# Altium footprint library LOGTURTLE_APR_25_TX.PcbLib: 88 footprints (part 2 of 6)
Each footprint in its own frame and in the unit in brackets; x right, y up, seen from the top. Pads: shape width x height; smd on the part's side, far side on the other; paste and mask are expansions set on the pad; w line width, h text height; cw(c..) or ccw(c..) is an arc to the next point about the centre after c.
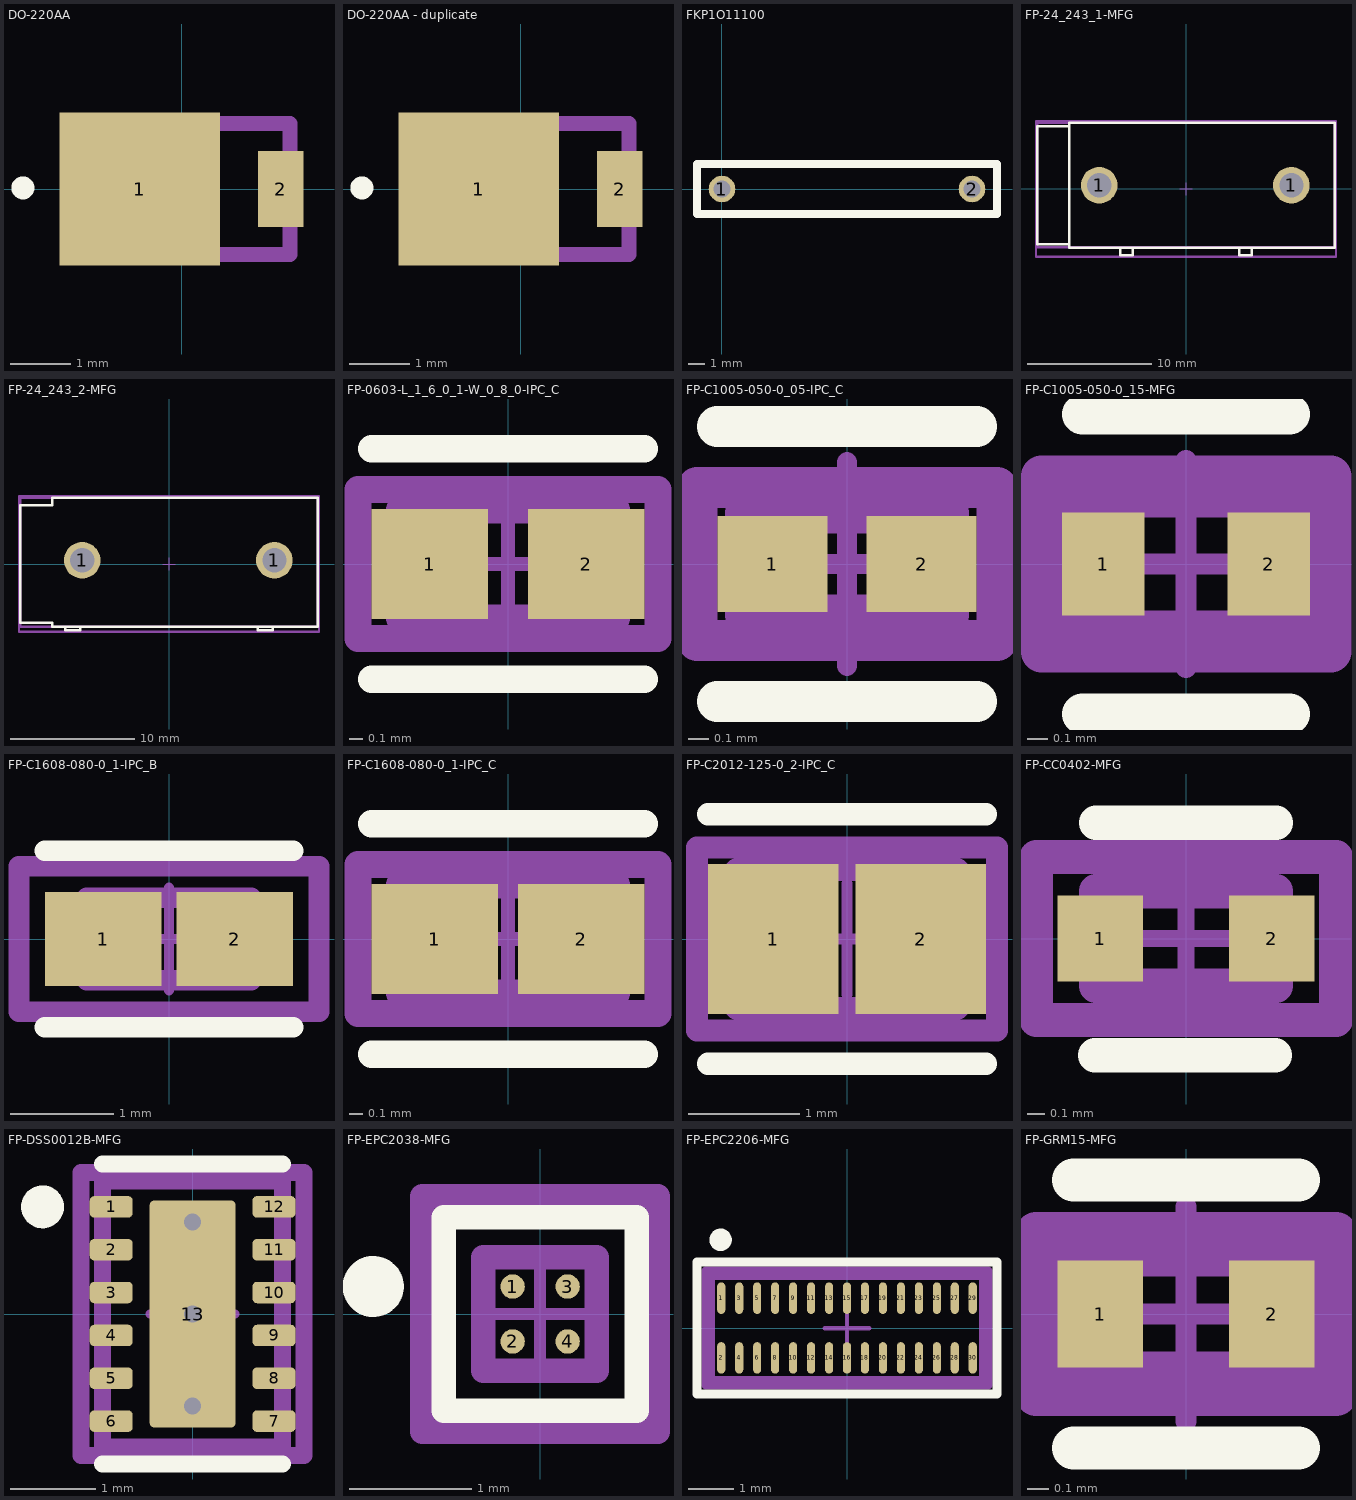
[diagram p1: the footprints below, top view; thin cyan lines are the x and y axes]

## DO-220AA [mil]
pads (2):
  rect 105.12x100 smd: 1(-27.5,0)
  rect 30x50 smd: 2(65.06,0)
Top Overlay:
  circle w10: c-104.06,0.75 r2.55
Mechanical 13:
  lines w10: -71.06,-42.91 71.06,-42.91 71.06,42.91 -71.06,42.91 -71.06,-42.91
3D body "SS2PH10-M3_84A.stp": height 39.37, standoff 0, extent -74.73,-40.07 76.84,39.85

## DO-220AA - duplicate [mil]
pads (2):
  rect 105.12x100 smd: 1(-27.5,0)
  rect 30x50 smd: 2(65.06,0)
Top Overlay:
  circle w10: c-104.06,0.75 r2.55
Mechanical 13:
  lines w10: -71.06,-42.91 71.06,-42.91 71.06,42.91 -71.06,42.91 -71.06,-42.91
3D body "SS2PH10-M3_84A.stp": height 39.37, standoff 0, extent -74.73,-40.07 76.84,39.85

## FKP1O11100 [mm]
pads (2):
  round 1.6 hole 1: 1(0,0) 2(15,0)
Top Overlay:
  lines w0.5: -1.5,-1.5 -1.5,1.5 0,1.5 15,1.5 16.5,1.5 16.5,-1.5 15,-1.5 0,-1.5 -1.5,-1.5

## FP-24_243_1-MFG [mm]
pads (2):
  round 2.95 hole 1.95 paste-2539.97 mask+0: 1(-7,0.3) 1(8.5,0.3)
Top Overlay:
  lines w0.2: -12,-4.45 -9.4,-4.45 -9.4,5.05 -12,5.05 -12,-4.45 ; -9.4,-4.75 12,-4.75 12,5.35 -9.4,5.35 -9.4,-4.75 ; -5.3,-5.35 -4.3,-5.35 -4.3,-4.75 -5.3,-4.75 -5.3,-5.35 ; 4.3,-5.35 5.3,-5.35 5.3,-4.75 4.3,-4.75 4.3,-5.35
Top 3D Body:
  lines w0.2: -12,-4.699 12,-4.699 12,5.35 -12,5.35 -12,-4.699
Top Courtyard:
  lines w0.2: -12.1,-5.45 12.1,-5.45 12.1,5.45 -12.1,5.45 -12.1,-5.45
Top Assembly:
  lines w0.2: -12.1,-5.461 12.1,-5.461 12.1,5.45 -12.1,5.45 -12.1,-5.461
  text ".Designator" at 0,0.188 h1
Top Component Center:
  lines w0.1: -0.5,0 0.5,0 ; 0,-0.5 0,0.5
3D body "Conn_Multicomp_24_243_1_eec.STEP": height 0.25, standoff 0, extent -10.576,-4.815 13.624,6.085

## FP-24_243_2-MFG [mm]
pads (2):
  round 2.95 hole 1.95 paste-2539.97 mask+0: 1(-7,0.3) 1(8.5,0.3)
Top Overlay:
  lines w0.2: -8.35,-5.05 -8.35,-5.35 -7.15,-5.35 -7.15,-5.05 ; 7.15,-5.05 7.15,-5.35 8.35,-5.35 8.35,-5.05 ; -12,-4.75 -9.4,-4.75 -9.4,-5.05 12,-5.05 12,5.35 -9.4,5.35 -9.4,4.75 -12,4.75 -12,-4.75
Top 3D Body:
  lines w0.2: -12,-5.08 12,-5.08 12,5.35 -12,5.35 -12,-5.08
Top Courtyard:
  lines w0.2: -12.1,-5.45 12.1,-5.45 12.1,5.45 -12.1,5.45 -12.1,-5.45
Top Assembly:
  lines w0.2: -12.1,-5.45 12.1,-5.45 12.1,5.45 -12.1,5.45 -12.1,-5.45
  text ".Designator" at 0,0.188 h1
Top Component Center:
  lines w0.1: -0.5,0 0.5,0 ; 0,-0.5 0,0.5
3D body "Conn_Multicomp_24_243_2_eec.STEP": height 0.25, standoff 0, extent -12.1,-5.45 12.1,5.45

## FP-0603-L_1_6_0_1-W_0_8_0-IPC_C [mm]
pads (2):
  rect 0.858x0.812 smd paste+0 mask+0: 1(-0.577,0) 2(0.577,0)
Top Overlay:
  lines w0.2: -1.006,-0.85 1.006,-0.85 ; -1.006,0.85 1.006,0.85
Top 3D Body:
  lines w0.2: -0.8,-0.4 -0.8,0.4 0.8,0.4 0.8,-0.4 -0.8,-0.4
Top Courtyard:
  lines w0.2: -1.106,-0.55 -1.106,0.55 1.106,0.55 1.106,-0.55 -1.106,-0.55
Top Assembly:
  lines w0.2: -1.106,-0.55 -1.106,0.55 1.106,0.55 1.106,-0.55 -1.106,-0.55
  text ".Designator" at 0,0.188 h1
Top Component Center:
  lines w0.1: -0.5,0 0.5,0 ; 0,-0.5 0,0.5
3D body "Cap_Taiyo_Yuden_JMK107BJ105KAHT_eec.STEP": height 0.25, standoff 0, extent -1.106,-0.55 1.106,0.55

## FP-C1005-050-0_05-IPC_C [mm]
pads (2):
  rect 0.539x0.472 smd paste+0 mask+0: 1(-0.367,0) 2(0.367,0)
Top Overlay:
  lines w0.2: -0.636,-0.675 0.636,-0.675 ; -0.636,0.675 0.636,0.675
Top 3D Body:
  lines w0.2: -0.5,-0.25 -0.5,0.25 0.5,0.25 0.5,-0.25 -0.5,-0.25
Top Courtyard:
  lines w0.2: -0.736,-0.375 -0.736,0.375 0.736,0.375 0.736,-0.375 -0.736,-0.375
Top Assembly:
  lines w0.2: -0.736,-0.375 -0.736,0.375 0.736,0.375 0.736,-0.375 -0.736,-0.375
  text ".Designator" at 0,0.188 h1
Top Component Center:
  lines w0.1: -0.5,0 0.5,0 ; 0,-0.5 0,0.5
3D body "Cap_TDK_C1005X6S1C105K050BC_eec.STEP": height 0.25, standoff 0, extent -0.736,-0.375 0.736,0.375

## FP-C1005-050-0_15-MFG [mm]
pads (2):
  rect 0.4x0.5 smd paste+0 mask+0: 1(-0.4,0) 2(0.4,0)
Top Overlay:
  lines w0.2: -0.5,-0.725 0.5,-0.725 ; -0.5,0.725 0.5,0.725
Top 3D Body:
  lines w0.2: -0.575,-0.325 -0.575,0.325 0.575,0.325 0.575,-0.325 -0.575,-0.325
Top Courtyard:
  lines w0.2: -0.7,-0.425 -0.7,0.425 0.7,0.425 0.7,-0.425 -0.7,-0.425
Top Assembly:
  lines w0.2: -0.7,-0.425 -0.7,0.425 0.7,0.425 0.7,-0.425 -0.7,-0.425
  text ".Designator" at 0,0.188 h1
Top Component Center:
  lines w0.1: -0.5,0 0.5,0 ; 0,-0.5 0,0.5
3D body "Cap_TDK_C1005X5R1A475M050BC_eec.STEP": height 0.25, standoff 0, extent -0.7,-0.425 0.7,0.425

## FP-C1608-080-0_1-IPC_B [mm]
pads (2):
  rect 1.131x0.912 smd paste+0 mask+0: 1(-0.641,0) 2(0.641,0)
Top Overlay:
  lines w0.2: -1.206,-0.856 1.206,-0.856 ; -1.206,0.856 1.206,0.856
Top 3D Body:
  lines w0.2: -0.8,-0.4 0.8,-0.4 0.8,0.4 -0.8,0.4 -0.8,-0.4
Top Courtyard:
  lines w0.2: -1.456,-0.706 1.456,-0.706 1.456,0.706 -1.456,0.706 -1.456,-0.706
Top Assembly:
  lines w0.2: -1.456,-0.706 1.456,-0.706 1.456,0.706 -1.456,0.706 -1.456,-0.706
  text ".Designator" at 0,0.188 h1
Top Component Center:
  lines w0.1: -0.5,0 0.5,0 ; 0,-0.5 0,0.5
3D body "Cap_TDK_C1608X6S0G106K080AB_eec.STEP": height 0.25, standoff 0, extent -1.456,-0.706 1.456,0.706

## FP-C1608-080-0_1-IPC_C [mm]
pads (2):
  rect 0.931x0.812 smd paste+0 mask+0: 1(-0.541,0) 2(0.541,0)
Top Overlay:
  lines w0.2: -1.006,-0.85 1.006,-0.85 ; -1.006,0.85 1.006,0.85
Top 3D Body:
  lines w0.2: -0.8,-0.4 0.8,-0.4 0.8,0.4 -0.8,0.4 -0.8,-0.4
Top Courtyard:
  lines w0.2: -1.106,-0.55 1.106,-0.55 1.106,0.55 -1.106,0.55 -1.106,-0.55
Top Assembly:
  lines w0.2: -1.106,-0.55 1.106,-0.55 1.106,0.55 -1.106,0.55 -1.106,-0.55
  text ".Designator" at 0,0.188 h1
Top Component Center:
  lines w0.1: -0.5,0 0.5,0 ; 0,-0.5 0,0.5
3D body "Cap_TDK_C1608X6S0G106K080AB_eec.STEP": height 0.25, standoff 0, extent -1.106,-0.55 1.106,0.55

## FP-C2012-125-0_2-IPC_C [mm]
pads (2):
  rect 1.178x1.356 smd paste+0 mask+0: 1(-0.664,0) 2(0.664,0)
Top Overlay:
  lines w0.2: -1.253,-1.125 1.253,-1.125 ; -1.253,1.125 1.253,1.125
Top 3D Body:
  lines w0.2: -1,-0.625 -1,0.625 1,0.625 1,-0.625 -1,-0.625
Top Courtyard:
  lines w0.2: -1.353,-0.825 -1.353,0.825 1.353,0.825 1.353,-0.825 -1.353,-0.825
Top Assembly:
  lines w0.2: -1.353,-0.825 -1.353,0.825 1.353,0.825 1.353,-0.825 -1.353,-0.825
  text ".Designator" at 0,0.188 h1
Top Component Center:
  lines w0.1: -0.5,0 0.5,0 ; 0,-0.5 0,0.5
3D body "Cap_TDK_C2012X7R1E474K125AA_eec.STEP": height 0.25, standoff 0, extent -1.353,-0.825 1.353,0.825

## FP-CC0402-MFG [mm]
pads (2):
  rect 0.5x0.5 smd paste+0 mask+0: 1(-0.5,0) 2(0.5,0)
Top Overlay:
  lines w0.2: -0.53,-0.681 0.52,-0.681 ; -0.525,0.675 0.525,0.675
Top 3D Body:
  lines w0.2: -0.525,-0.275 -0.525,0.275 0.525,0.275 0.525,-0.275 -0.525,-0.275
Top Courtyard:
  lines w0.2: -0.875,-0.475 -0.875,0.475 0.875,0.475 0.875,-0.475 -0.875,-0.475
Top Assembly:
  lines w0.2: -0.875,-0.475 -0.875,0.475 0.875,0.475 0.875,-0.475 -0.875,-0.475
  text ".Designator" at 0,0.188 h1
Top Component Center:
  lines w0.1: -0.5,0 0.5,0 ; 0,-0.5 0,0.5
3D body "Cap_YAGEO_CC0402KRX7R9BB101_eec.STEP": height 0.25, standoff 0, extent -0.875,-0.475 0.875,0.475

## FP-DSS0012B-MFG [mm]
pads (13):
  rrect40% 0.5x0.25 smd paste+0 mask+0: 1(-0.95,1.25) 2(-0.95,0.75) 3(-0.95,0.25) 4(-0.95,-0.25) 5(-0.95,-0.75) 6(-0.95,-1.25) 7(0.95,-1.25) 8(0.95,-0.75) 9(0.95,-0.25) 10(0.95,0.25) 11(0.95,0.75) 12(0.95,1.25)
  rrect10% 1x2.65 smd paste-1000 mask+0: 13(0,0)
via 0,-1.075 diameter 0.5 hole 0.2
via 0,0 diameter 0.5 hole 0.2
via 0,1.075 diameter 0.5 hole 0.2
Top Overlay:
  circle w0.25: c-1.75,1.25 r0.125
  lines w0.2: -1.05,-1.75 1.05,-1.75 ; -1.05,1.75 1.05,1.75
Top Paste:
  region: 0.475,-1.22 0.475,-1.23 0.467,-1.248 0.453,-1.262 0.435,-1.27 0.425,-1.27 -0.425,-1.27 -0.435,-1.27 -0.453,-1.262 -0.467,-1.248 -0.475,-1.23 -0.475,-1.22 -0.475,-0.15 -0.475,-0.14 -0.467,-0.122 -0.453,-0.108 -0.435,-0.1 -0.425,-0.1 0.425,-0.1 0.435,-0.1 0.453,-0.108 0.467,-0.122 0.475,-0.14 0.475,-0.15
  region: 0.475,1.22 0.475,0.15 0.475,0.14 0.467,0.122 0.453,0.108 0.435,0.1 0.425,0.1 -0.425,0.1 -0.435,0.1 -0.453,0.108 -0.467,0.122 -0.475,0.14 -0.475,0.15 -0.475,1.22 -0.475,1.23 -0.467,1.248 -0.453,1.262 -0.435,1.27 -0.425,1.27 0.425,1.27 0.435,1.27 0.453,1.262 0.467,1.248 0.475,1.23
Top 3D Body:
  lines w0.2: -1.05,-1.55 -1.05,1.55 1.05,1.55 1.05,-1.55 -1.05,-1.55
Top Courtyard:
  lines w0.2: -1.3,-1.65 -1.3,1.65 1.3,1.65 1.3,-1.65 -1.3,-1.65
Top Assembly:
  lines w0.2: -1.3,-1.65 -1.3,1.65 1.3,1.65 1.3,-1.65 -1.3,-1.65
  text ".Designator" at 0,-0.001 h1
Top Component Center:
  lines w0.1: -0.5,0 0.5,0 ; 0,-0.5 0,0.5
3D body "IC_Texas_Instruments_LM27762DSSR_eec.STEP": height 0.25, standoff 0, extent -1.3,-1.65 1.3,1.65

## FP-EPC2038-MFG [mm]
pads (4):
  round 0.2 smd paste-1000 mask-1000: 1(-0.225,0.225) 2(-0.225,-0.225) 3(0.225,0.225) 4(0.225,-0.225)
Top Overlay:
  circle w0.25: c-1.365,0.225 r0.125
  lines w0.2: -0.79,-0.79 -0.79,0.79 0.79,0.79 0.79,-0.79 -0.79,-0.79
Top Paste:
  region: 0.1,-0.16 0.1,-0.148 0.109,-0.126 0.126,-0.109 0.148,-0.1 0.16,-0.1 0.29,-0.1 0.302,-0.1 0.324,-0.109 0.341,-0.126 0.35,-0.148 0.35,-0.16 0.35,-0.29 0.35,-0.302 0.341,-0.324 0.324,-0.341 0.302,-0.35 0.29,-0.35 0.16,-0.35 0.148,-0.35 0.126,-0.341 0.109,-0.324 0.1,-0.302 0.1,-0.29
  region: -0.16,-0.35 -0.29,-0.35 -0.302,-0.35 -0.324,-0.341 -0.341,-0.324 -0.35,-0.302 -0.35,-0.29 -0.35,-0.16 -0.35,-0.148 -0.341,-0.126 -0.324,-0.109 -0.302,-0.1 -0.29,-0.1 -0.16,-0.1 -0.148,-0.1 -0.126,-0.109 -0.109,-0.126 -0.1,-0.148 -0.1,-0.16 -0.1,-0.29 -0.1,-0.302 -0.109,-0.324 -0.126,-0.341 -0.148,-0.35
  region: -0.16,0.35 -0.148,0.35 -0.126,0.341 -0.109,0.324 -0.1,0.302 -0.1,0.29 -0.1,0.16 -0.1,0.148 -0.109,0.126 -0.126,0.109 -0.148,0.1 -0.16,0.1 -0.29,0.1 -0.302,0.1 -0.324,0.109 -0.341,0.126 -0.35,0.148 -0.35,0.16 -0.35,0.29 -0.35,0.302 -0.341,0.324 -0.324,0.341 -0.302,0.35 -0.29,0.35
  region: 0.16,0.35 0.29,0.35 0.302,0.35 0.324,0.341 0.341,0.324 0.35,0.302 0.35,0.29 0.35,0.16 0.35,0.148 0.341,0.126 0.324,0.109 0.302,0.1 0.29,0.1 0.16,0.1 0.148,0.1 0.126,0.109 0.109,0.126 0.1,0.148 0.1,0.16 0.1,0.29 0.1,0.302 0.109,0.324 0.126,0.341 0.148,0.35
Top Solder:
  region: 0.1,-0.16 0.1,-0.148 0.109,-0.126 0.126,-0.109 0.148,-0.1 0.16,-0.1 0.29,-0.1 0.302,-0.1 0.324,-0.109 0.341,-0.126 0.35,-0.148 0.35,-0.16 0.35,-0.29 0.35,-0.302 0.341,-0.324 0.324,-0.341 0.302,-0.35 0.29,-0.35 0.16,-0.35 0.148,-0.35 0.126,-0.341 0.109,-0.324 0.1,-0.302 0.1,-0.29
  region: -0.16,-0.35 -0.29,-0.35 -0.302,-0.35 -0.324,-0.341 -0.341,-0.324 -0.35,-0.302 -0.35,-0.29 -0.35,-0.16 -0.35,-0.148 -0.341,-0.126 -0.324,-0.109 -0.302,-0.1 -0.29,-0.1 -0.16,-0.1 -0.148,-0.1 -0.126,-0.109 -0.109,-0.126 -0.1,-0.148 -0.1,-0.16 -0.1,-0.29 -0.1,-0.302 -0.109,-0.324 -0.126,-0.341 -0.148,-0.35
  region: -0.16,0.35 -0.148,0.35 -0.126,0.341 -0.109,0.324 -0.1,0.302 -0.1,0.29 -0.1,0.16 -0.1,0.148 -0.109,0.126 -0.126,0.109 -0.148,0.1 -0.16,0.1 -0.29,0.1 -0.302,0.1 -0.324,0.109 -0.341,0.126 -0.35,0.148 -0.35,0.16 -0.35,0.29 -0.35,0.302 -0.341,0.324 -0.324,0.341 -0.302,0.35 -0.29,0.35
  region: 0.16,0.35 0.29,0.35 0.302,0.35 0.324,0.341 0.341,0.324 0.35,0.302 0.35,0.29 0.35,0.16 0.35,0.148 0.341,0.126 0.324,0.109 0.302,0.1 0.29,0.1 0.16,0.1 0.148,0.1 0.126,0.109 0.109,0.126 0.1,0.148 0.1,0.16 0.1,0.29 0.1,0.302 0.109,0.324 0.126,0.341 0.148,0.35
Top 3D Body:
  lines w0.2: -0.465,-0.465 -0.465,0.465 0.465,0.465 0.465,-0.465 -0.465,-0.465
Top Courtyard:
  lines w0.2: -0.965,-0.965 -0.965,0.965 0.965,0.965 0.965,-0.965 -0.965,-0.965
Top Assembly:
  lines w0.2: -0.965,-0.965 -0.965,0.965 0.965,0.965 0.965,-0.965 -0.965,-0.965
  text ".Designator" at 0,0.188 h1
Top Component Center:
  lines w0.1: -0.5,0 0.5,0 ; 0,-0.5 0,0.5
3D body "Trans_EPC_EPC2038_eec.STEP": height 0.25, standoff 0, extent -0.965,-0.965 0.965,0.965

## FP-EPC2206-MFG [mm]
pads (30):
  rrect100% 0.18x0.7 smd paste-1000 mask-1000: 1(-2.8,0.665) 2(-2.8,-0.665) 3(-2.4,0.665) 4(-2.4,-0.665) 5(-2,0.665) 6(-2,-0.665) 7(-1.6,0.665) 8(-1.6,-0.665) 9(-1.2,0.665) 10(-1.2,-0.665) 11(-0.8,0.665) 12(-0.8,-0.665) 13(-0.4,0.665) 14(-0.4,-0.665) 15(0,0.665) 16(0,-0.665) 17(0.4,0.665) 18(0.4,-0.665) 19(0.8,0.665) 20(0.8,-0.665) 21(1.2,0.665) 22(1.2,-0.665) 23(1.6,0.665) 24(1.6,-0.665) 25(2,0.665) 26(2,-0.665) 27(2.4,0.665) 28(2.4,-0.665) 29(2.8,0.665) 30(2.8,-0.665)
Top Overlay:
  circle w0.25: c-2.815,1.965 r0.125
  lines w0.2: -3.34,-1.465 -3.34,1.465 3.34,1.465 3.34,-1.465 -3.34,-1.465
Top Paste:
  drawing of 30 lines, arcs and shapes, not listed
Top Solder:
  drawing of 30 lines, arcs and shapes, not listed
Top 3D Body:
  lines w0.2: -3.04,-1.165 -3.04,1.165 3.04,1.165 3.04,-1.165 -3.04,-1.165
Top Courtyard:
  lines w0.2: -3.14,-1.265 -3.14,1.265 3.14,1.265 3.14,-1.265 -3.14,-1.265
Top Assembly:
  lines w0.2: -3.14,-1.265 -3.14,1.265 3.14,1.265 3.14,-1.265 -3.14,-1.265
  text ".Designator" at 0,-0.001 h1
Top Component Center:
  lines w0.1: -0.5,0 0.5,0 ; 0,-0.5 0,0.5
3D body "Trans_EPC_EPC2206_eec.STEP": height 0.25, standoff 0, extent -3.14,-1.265 3.14,1.265

## FP-GRM15-MFG [mm]
pads (2):
  rect 0.4x0.5 smd paste+0 mask+0: 1(-0.4,0) 2(0.4,0)
Top Overlay:
  lines w0.2: -0.525,-0.625 0.525,-0.625 ; -0.525,0.625 0.525,0.625
Top 3D Body:
  lines w0.2: -0.525,-0.275 -0.525,0.275 0.525,0.275 0.525,-0.275 -0.525,-0.275
Top Courtyard:
  lines w0.2: -0.7,-0.375 -0.7,0.375 0.7,0.375 0.7,-0.375 -0.7,-0.375
Top Assembly:
  lines w0.2: -0.7,-0.375 -0.7,0.375 0.7,0.375 0.7,-0.375 -0.7,-0.375
  text ".Designator" at 0,0.188 h1
Top Component Center:
  lines w0.1: -0.5,0 0.5,0 ; 0,-0.5 0,0.5
3D body "Cap_Murata_GRM155R71C104KA88D_eec.STEP": height 0.25, standoff 0, extent -0.7,-0.375 0.7,0.375